# Altium footprint library SMT.PcbLib: 325 footprints (part 15 of 21)
Each footprint in its own frame and in the unit in brackets; x right, y up, seen from the top. Pads: shape width x height; smd on the part's side, far side on the other; paste and mask are expansions set on the pad; w line width, h text height; cw(c..) or ccw(c..) is an arc to the next point about the centre after c.
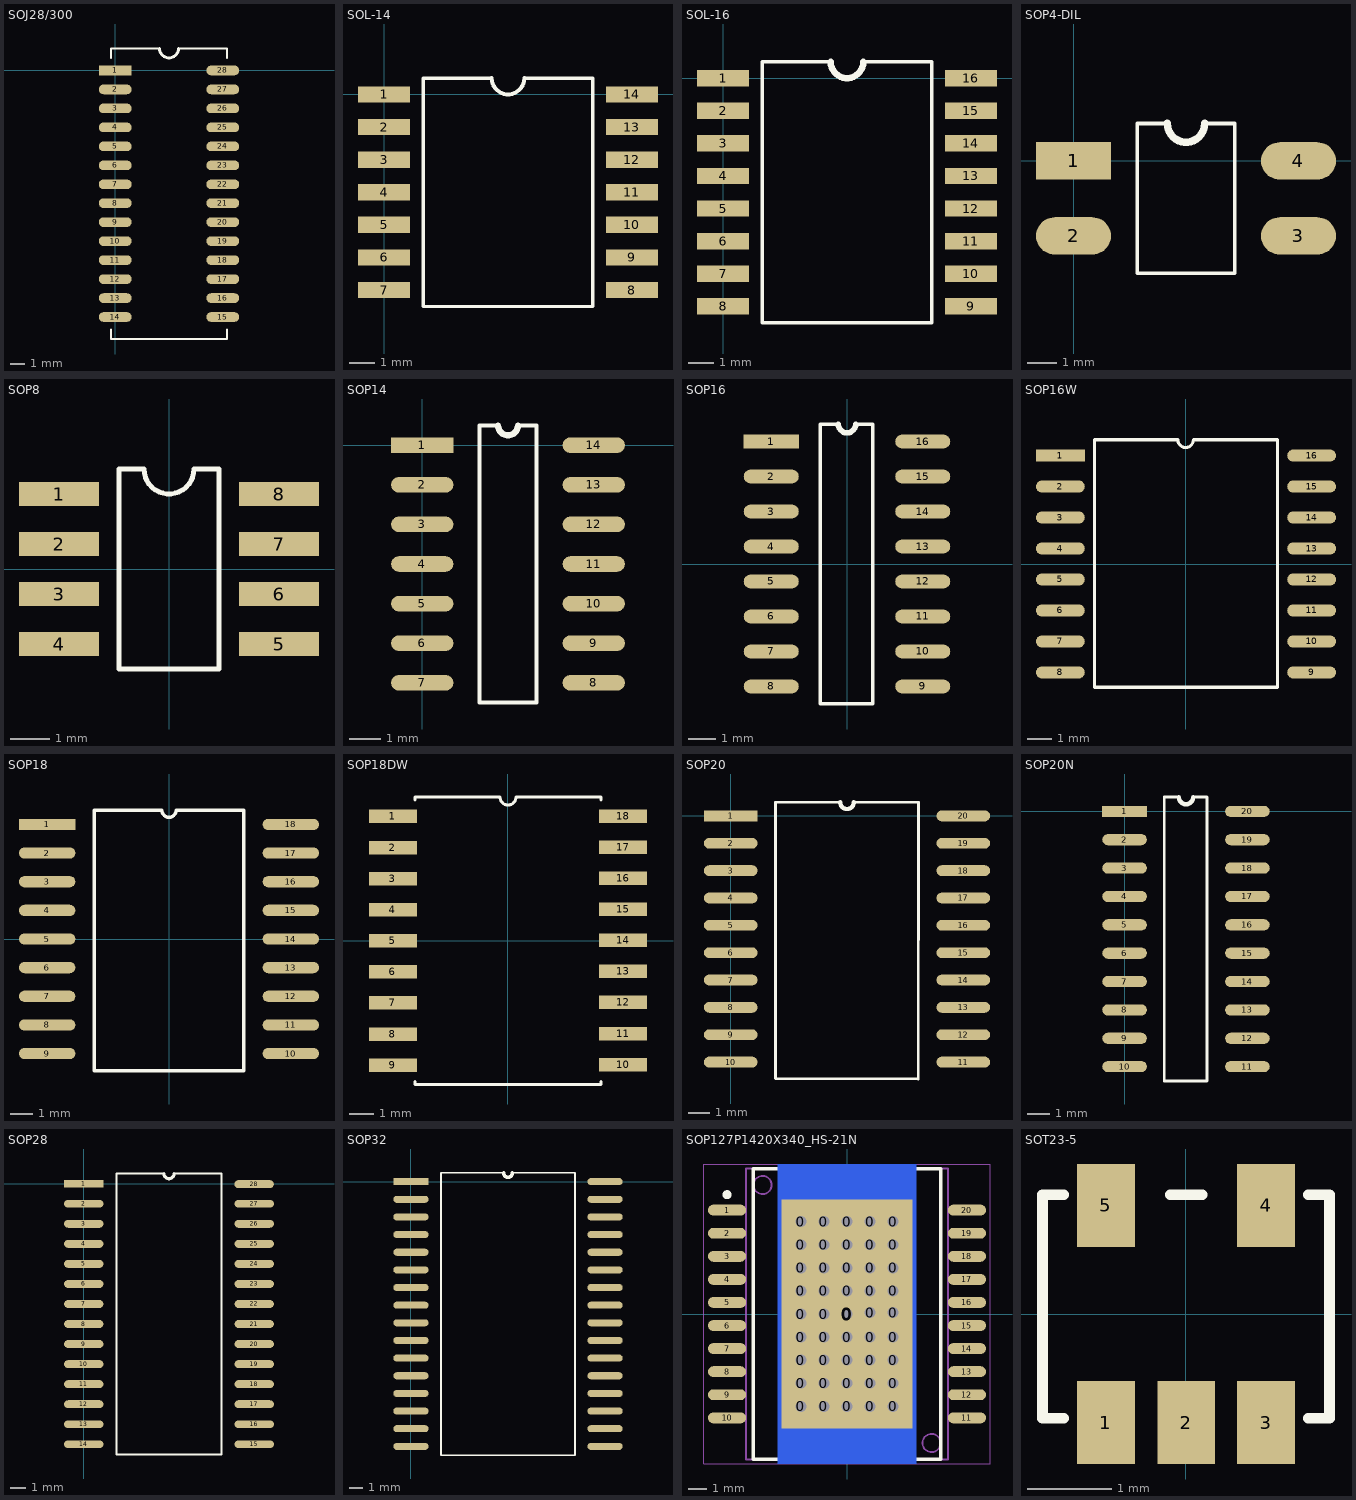
[diagram p14: the footprints below, top view; thin cyan lines are the x and y axes]

## SOJ28/300 [mm]
pads (28):
  rect 2.2x0.65 smd: 1(0,0)
  oval 2.2x0.65 smd: 2(0,-1.27) 3(0,-2.54) 4(0,-3.81) 5(0,-5.08) 6(0,-6.35) 7(0,-7.62) 8(0,-8.89) 9(0,-10.16) 10(0,-11.43) 11(0,-12.7) 12(0,-13.97) 13(0,-15.24) 14(0,-16.51) 15(7.2,-16.51) 16(7.2,-15.24) 17(7.2,-13.97) 18(7.2,-12.7) 19(7.2,-11.43) 20(7.2,-10.16) 21(7.2,-8.89) 22(7.2,-7.62) 23(7.2,-6.35) 24(7.2,-5.08) 25(7.2,-3.81) 26(7.2,-2.54) 27(7.2,-1.27) 28(7.2,0)
TopOverlay:
  lines w0.127: -0.275,-17.335 -0.275,-17.98 7.475,-17.98 7.475,-17.335 ; -0.275,0.825 -0.275,1.47 2.965,1.47 ; 4.235,1.47 7.475,1.47 7.475,0.825
  lines w0.2: 2.965,1.47 ccw(c3.6,1.47) 4.235,1.47

## SOL-14 [mil] "SOP 14 WIDE"
height 126.77
pads (14):
  rect 80x25 smd: 1(0,0) 2(0,-50) 3(0,-100) 4(0,-150) 5(0,-200) 6(0,-250) 7(0,-300) 8(380,-300) 9(380,-250) 10(380,-200) 11(380,-150) 12(380,-100) 13(380,-50) 14(380,0)
TopOverlay:
  lines w5: 165,25 60,25 60,-325 320,-325 320,25 215,25
  lines w6: 165,25 ccw(c190,25) 215,25

## SOL-16 [mil]
pads (16):
  rect 80x25 smd: 1(0,0) 2(0,-50) 3(0,-100) 4(0,-150) 5(0,-200) 6(0,-250) 7(0,-300) 8(0,-350) 9(380,-350) 10(380,-300) 11(380,-250) 12(380,-200) 13(380,-150) 14(380,-100) 15(380,-50) 16(380,0)
TopOverlay:
  lines w5: 165,25 60,25 60,-375 320,-375 320,25 215,25
  lines w10: 165,25 ccw(c190,25) 215,25

## SOP4-DIL [mm]
pads (4):
  rect 2.54x1.27 smd: 1(0,0)
  oval 2.54x1.27 smd: 2(0,-2.54) 3(7.62,-2.54) 4(7.62,0)
TopOverlay:
  lines w0.127: 3.175,1.27 2.159,1.27 2.159,-3.81 5.461,-3.81 5.461,1.27 4.445,1.27
  lines w0.254: 3.175,1.27 ccw(c3.81,1.27) 4.445,1.27

## SOP8 [mil]
pads (8):
  rect 80x24 smd: 1(-110,75) 2(-110,25) 3(-110,-25) 4(-110,-75) 5(110,-75) 6(110,-25) 7(110,25) 8(110,75)
TopOverlay:
  lines w5: -50,-100 50,-100 50,100 25,100 cw(c0,100) -25,100 -50,100 -50,-100
3D body: height 68.9, standoff 0, extent -78.74,-98.43 78.74,98.43

## SOP14 [mm]
pads (14):
  rect 2x0.5 smd: 1(0,0)
  oval 2x0.5 smd: 2(0,-1.27) 3(0,-2.54) 4(0,-3.81) 5(0,-5.08) 6(0,-6.35) 7(0,-7.62) 8(5.5,-7.62) 9(5.5,-6.35) 10(5.5,-5.08) 11(5.5,-3.81) 12(5.5,-2.54) 13(5.5,-1.27) 14(5.5,0)
TopOverlay:
  lines w0.127: 2.433,0.635 1.835,0.635 1.835,-8.255 3.665,-8.255 3.665,0.635 3.068,0.635
  lines w0.2: 2.433,0.635 ccw(c2.75,0.635) 3.068,0.635

## SOP16 [mm]
pads (16):
  rect 2x0.5 smd: 1(-2.75,4.445)
  oval 2x0.5 smd: 2(-2.75,3.175) 3(-2.75,1.905) 4(-2.75,0.635) 5(-2.75,-0.635) 6(-2.75,-1.905) 7(-2.75,-3.175) 8(-2.75,-4.445) 9(2.75,-4.445) 10(2.75,-3.175) 11(2.75,-1.905) 12(2.75,-0.635) 13(2.75,0.635) 14(2.75,1.905) 15(2.75,3.175) 16(2.75,4.445)
TopOverlay:
  lines w0.127: -0.972,-5.08 -0.972,5.08 -0.317,5.08 ; -0.915,-5.08 0.915,-5.08 ; 0.318,5.08 0.933,5.08 0.933,-5.08
  lines w0.2: -0.317,5.08 ccw(c0,5.08) 0.318,5.08
3D body: height 1.75, standoff 0, extent -2.25,-5.055 2.25,5.145

## SOP16W [mm]
pads (16):
  rect 2x0.5 smd: 1(-5.15,4.445)
  oval 2x0.5 smd: 2(-5.15,3.175) 3(-5.15,1.905) 4(-5.15,0.635) 5(-5.15,-0.635) 6(-5.15,-1.905) 7(-5.15,-3.175) 8(-5.15,-4.445) 9(5.15,-4.445) 10(5.15,-3.175) 11(5.15,-1.905) 12(5.15,-0.635) 13(5.15,0.635) 14(5.15,1.905) 15(5.15,3.175) 16(5.15,4.445)
TopOverlay:
  lines w0.127: -0.35,5.095 -3.75,5.095 -3.75,-5.055 3.75,-5.055 3.75,5.095 0.3,5.095 cw(c-0.018,5.095) -0.335,5.095

## SOP18 [mm] "Type  -  AFWG"
height 0.072
pads (18):
  rect 2.5x0.5 smd: 1(-5.4,5.08)
  oval 2.5x0.5 smd: 2(-5.4,3.81) 3(-5.4,2.54) 4(-5.4,1.27) 5(-5.4,0) 6(-5.4,-1.27) 7(-5.4,-2.54) 8(-5.4,-3.81) 9(-5.4,-5.08) 10(5.4,-5.08) 11(5.4,-3.81) 12(5.4,-2.54) 13(5.4,-1.27) 14(5.4,0) 15(5.4,1.27) 16(5.4,2.54) 17(5.4,3.81) 18(5.4,5.08)
TopOverlay:
  lines w0.152: -3.317,-5.842 3.315,-5.842 3.315,5.715 0.317,5.715 cw(c0,5.715) -0.318,5.715 -3.315,5.715 -3.317,-5.842

## SOP18DW [mm] "DW"
height 2.65
pads (18):
  rect 1.95x0.55 smd: 1(-4.7,5.08) 2(-4.7,3.81) 3(-4.7,2.54) 4(-4.7,1.27) 5(-4.7,0) 6(-4.7,-1.27) 7(-4.7,-2.54) 8(-4.7,-3.81) 9(-4.7,-5.08) 10(4.7,-5.06) 11(4.7,-3.79) 12(4.7,-2.52) 13(4.7,-1.25) 14(4.7,0.02) 15(4.7,1.29) 16(4.7,2.56) 17(4.7,3.83) 18(4.7,5.08)
TopOverlay:
  lines w0.127: -3.799,-5.75 -3.799,-5.875 0.327,-5.875 3.799,-5.875 3.799,-5.75 ; -3.799,5.75 -3.799,5.875 -0.327,5.875 ccw(c0,5.875) 0.327,5.875 3.8,5.875 3.8,5.75
3D body: height 2.65, standoff 0, extent -3.799,-5.875 3.8,5.875

## SOP20 [mm]
pads (20):
  rect 2.5x0.5 smd: 1(0,0)
  oval 2.5x0.5 smd: 2(0,-1.27) 3(0,-2.54) 4(0,-3.81) 5(0,-5.08) 6(0,-6.35) 7(0,-7.62) 8(0,-8.89) 9(0,-10.16) 10(0,-11.43) 11(10.8,-11.43) 12(10.8,-10.16) 13(10.8,-8.89) 14(10.8,-7.62) 15(10.8,-6.35) 16(10.8,-5.08) 17(10.8,-3.81) 18(10.8,-2.54) 19(10.8,-1.27) 20(10.8,0)
TopOverlay:
  lines w0.127: 5.082,0.635 2.085,0.635 2.083,-12.192 8.712,-12.217 8.715,0.635 5.717,0.635
  lines w0.2: 5.082,0.635 ccw(c5.4,0.635) 5.717,0.635

## SOP20N [mm]
pads (20):
  rect 2x0.5 smd: 1(0,0)
  oval 2x0.5 smd: 2(0,-1.27) 3(0,-2.54) 4(0,-3.81) 5(0,-5.08) 6(0,-6.35) 7(0,-7.62) 8(0,-8.89) 9(0,-10.16) 10(0,-11.43) 11(5.5,-11.43) 12(5.5,-10.16) 13(5.5,-8.89) 14(5.5,-7.62) 15(5.5,-6.35) 16(5.5,-5.08) 17(5.5,-3.81) 18(5.5,-2.54) 19(5.5,-1.27) 20(5.5,0)
TopOverlay:
  lines w0.127: 1.778,-12.065 1.778,0.635 2.433,0.635 ; 1.835,-12.065 3.665,-12.065 ; 3.068,0.635 3.683,0.635 3.683,-12.065
  lines w0.2: 2.433,0.635 ccw(c2.75,0.635) 3.068,0.635

## SOP28 [mm]
pads (28):
  rect 2.5x0.5 smd: 1(0,0)
  oval 2.5x0.5 smd: 2(0,-1.27) 3(0,-2.54) 4(0,-3.81) 5(0,-5.08) 6(0,-6.35) 7(0,-7.62) 8(0,-8.89) 9(0,-10.16) 10(0,-11.43) 11(0,-12.7) 12(0,-13.97) 13(0,-15.24) 14(0,-16.51) 15(10.8,-16.51) 16(10.8,-15.24) 17(10.8,-13.97) 18(10.8,-12.7) 19(10.8,-11.43) 20(10.8,-10.16) 21(10.8,-8.89) 22(10.8,-7.62) 23(10.8,-6.35) 24(10.8,-5.08) 25(10.8,-3.81) 26(10.8,-2.54) 27(10.8,-1.27) 28(10.795,-0.025)
TopOverlay:
  lines w0.127: 5.082,0.635 2.085,0.635 2.085,-17.145 8.715,-17.145 8.715,0.635 5.717,0.635
  lines w0.2: 5.082,0.635 ccw(c5.4,0.635) 5.717,0.635

## SOP32 [mil]
pads (32):
  rect 100x20 smd: 1(0,0)
  oval 100x20 smd: 2(0,-50) 3(0,-100) 4(0,-150) 5(0,-200) 6(0,-250) 7(0,-300) 8(0,-350) 9(0,-400) 10(0,-450) 11(0,-500) 12(0,-550) 13(0,-600) 14(0,-650) 15(0,-700) 16(0,-750) 17(550,-750) 18(550,-700) 19(550,-650) 20(550,-600) 21(550,-550) 22(550,-500) 23(550,-450) 24(550,-400) 25(550,-350) 26(550,-300) 27(550,-250) 28(550,-200) 29(550,-150) 30(550,-100) 31(550,-50) 32(550,0)
TopOverlay:
  lines w5: 262.5,25 85,25 85,-775 465,-775 465,25 287.5,25
  lines w10: 262.5,25 ccw(c275,25) 287.5,25

## SOP127P1420X340_HS-21N [mm] "SOP, 20-Leads, Body 15.90x11.00mm, Pitch 1.27mm, Thermal Pad 12.60.2x7.20.2mm, IPC Medium Density"
height 3.4
pads (67):
  round 1 hole 0.6: 0(-2.54,-5.08) 0(-2.54,-3.81) 0(-2.54,-2.54) 0(-2.54,-1.27) 0(-2.54,0) 0(-2.54,1.27) 0(-2.54,2.54) 0(-2.54,3.81) 0(-2.54,5.08) 0(-1.27,-5.08) 0(-1.27,-3.81) 0(-1.27,-2.54) 0(-1.27,-1.27) 0(-1.27,0) 0(-1.27,1.27) 0(-1.27,2.54) 0(-1.27,3.81) 0(-1.27,5.08) 0(0,-5.08) 0(0,-3.81) 0(0,-2.54) 0(0,-1.27) 0(0,0) 0(0,1.27) 0(0,2.54) 0(0,3.81) 0(0,5.08) 0(1.27,-5.08) 0(1.27,-3.81) 0(1.27,-2.54) 0(1.27,-1.27) 0(1.27,0.075) 0(1.27,1.27) 0(1.27,2.54) 0(1.27,3.81) 0(1.27,5.08) 0(2.54,-5.08) 0(2.54,-3.81) 0(2.54,-2.54) 0(2.54,-1.27) 0(2.54,0.075) 0(2.54,1.27) 0(2.54,2.54) 0(2.54,3.81) 0(2.54,5.08)
  rect 7.2x12.6 smd: 0(0,0)
  rect 7.62x16.51 smd far side: 0(0,0)
  oval 2.1x0.6 smd: 1(-6.6,5.715) 2(-6.6,4.445) 3(-6.6,3.175) 4(-6.6,1.905) 5(-6.6,0.635) 6(-6.6,-0.635) 7(-6.6,-1.905) 8(-6.6,-3.175) 9(-6.6,-4.445) 10(-6.6,-5.715) 11(6.6,-5.715) 12(6.6,-4.445) 13(6.6,-3.175) 14(6.6,-1.905) 15(6.6,-0.635) 16(6.6,0.635) 17(6.6,1.905) 18(6.6,3.175) 19(6.6,4.445) 20(6.6,5.715)
TopOverlay:
  circle w0.25: c-6.6,6.565 r0.125
  lines w0.2: -5.15,-8 -5.15,8 5.15,8 5.15,-8 -5.15,-8
Mechanical13:
  circle w0.1: c-4.65,7.1 r0.5
  circle w0.1: c4.65,-7.1 r0.5
  lines w0.1: -5.55,-8 -5.55,8 5.55,8 5.55,-8 -5.55,-8
Mechanical15:
  lines w0.05: -7.875,-8.25 -7.875,8.25 7.875,8.25 7.875,-8.25 -7.875,-8.25
3D body: height 3.4, standoff 0.1, extent -5.55,-8 5.55,8

## SOT23-5 [mm]
height 1.19
pads (5):
  rect 0.69x0.99 smd: 1(-0.955,-1.295) 2(0.002,-1.295) 3(0.955,-1.295) 4(0.955,1.295) 5(-0.955,1.295)
TopOverlay:
  lines w0.127: -1.458,-1.245 -1.712,-1.245 -1.712,1.422 -1.458,1.422 ; -0.188,1.422 0.193,1.422 ; 1.458,-1.245 1.712,-1.245 1.712,1.422 1.458,1.422
3D body: height 1, standoff 0, extent -1.7,-1.25 1.7,1.425